# Altium footprint library Miscellaneous.PcbLib: 139 footprints (part 8 of 9)
Each footprint in its own frame and in the unit in brackets; x right, y up, seen from the top. Pads: shape width x height; smd on the part's side, far side on the other; paste and mask are expansions set on the pad; w line width, h text height; cw(c..) or ccw(c..) is an arc to the next point about the centre after c.
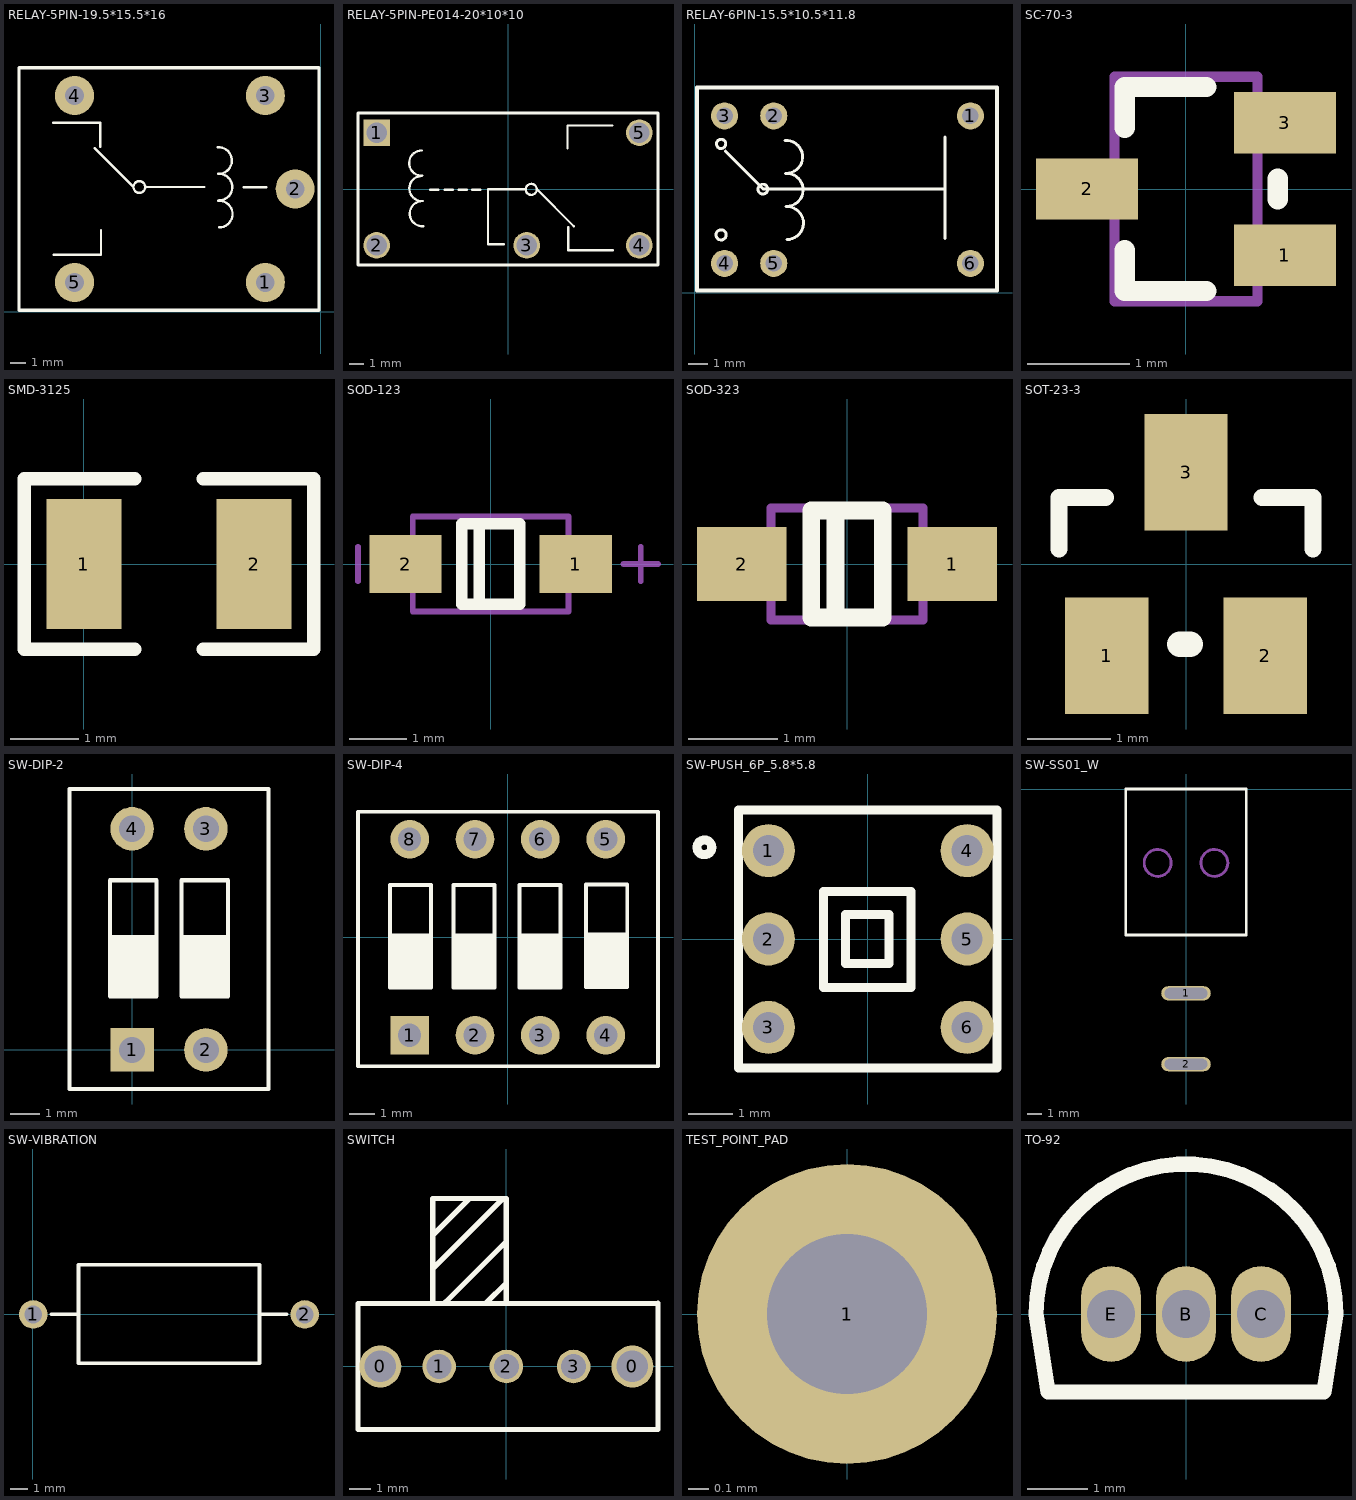
[diagram p7: the footprints below, top view; thin cyan lines are the x and y axes]

## RELAY-5PIN-19.5*15.5*16 [mm]
pads (5):
  round 2.5 hole 1.2: 1(-3.531,1.88) 2(-1.626,7.849) 3(-3.531,13.818) 4(-15.723,13.818) 5(-15.723,1.88)
Top Overlay:
  circle w0.152: c-11.582,7.976 r0.375
  lines w0.152: -17.107,12.09 -14.084,12.09 -14.084,10.541 ; -17.056,3.658 -14.034,3.658 -14.034,5.207 ; -14.453,10.465 -11.963,7.976 -11.957,7.976 ; -11.151,7.976 -7.442,7.976 ; -6.579,10.516 cw(c-6.518,9.669) -6.518,8.82 ; -6.553,8.814 cw(c-6.493,7.967) -6.493,7.118 ; -6.537,7.095 cw(c-6.477,6.248) -6.477,5.399 ; -4.902,7.95 -3.454,7.95
  lines w0.2: -19.279,1.753 -19.279,15.596 -0.102,15.596 -0.102,0.102 -19.279,0.102 -19.279,1.88
3D body "User Library-SONGLE Relay SRU-12VDC-SL-C.step": height 15.3, standoff -5, extent -19.278,0.172 -0.178,15.672

## RELAY-5PIN-PE014-20*10*10 [mm]
pads (5):
  rect 1.8x1.8 hole 1.4: 1(-8.89,3.81)
  round 1.8 hole 1.4: 2(-8.89,-3.81) 3(1.27,-3.81) 4(8.89,-3.81) 5(8.89,3.81)
Top Overlay:
  circle w0.152: c1.575,-0.025 r0.375
  lines w0.152: -5.842,2.602 ccw(c-5.842,1.753) -5.782,0.906 ; -5.826,0.883 ccw(c-5.826,0.034) -5.766,-0.813 ; -5.801,-0.819 ccw(c-5.801,-1.668) -5.74,-2.515 ; -5.258,-0.051 -4.699,-0.051 ; -4.293,-0.051 -3.734,-0.051 ; -3.353,-0.051 -2.794,-0.051 ; -2.413,-0.051 -1.854,-0.051 ; -1.346,-0.051 -1.346,-3.708 -1.346,-3.734 -0.279,-3.734 ; -1.346,-0.025 1.143,-0.025 ; 1.95,-0.025 1.956,-0.025 4.445,-2.515 ; 4.026,2.743 4.026,4.293 7.048,4.293 ; 4.077,-2.591 4.077,-4.14 7.099,-4.14
  lines w0.203: -10.15,-5.15 -10.15,5.15 10.15,5.15 10.15,-5.15 -10.15,-5.15

## RELAY-6PIN-15.5*10.5*11.8 [mm]
pads (6):
  round 1.4 hole 0.85: 1(14.249,9.144) 2(4.089,9.144) 3(1.549,9.144) 4(1.549,1.524) 5(4.089,1.524) 6(14.249,1.524)
Top Overlay:
  circle w0.152: c3.531,5.359 r0.254
  circle w0.152: c1.372,7.696 r0.241
  circle w0.152: c1.372,2.997 r0.262
  lines w0.152: 1.587,7.328 3.556,5.359 ; 3.581,5.359 12.929,5.359 ; 4.674,7.874 cw(c4.734,7.027) 4.734,6.178 ; 4.699,6.172 cw(c4.759,5.325) 4.759,4.477 ; 4.715,4.454 cw(c4.775,3.607) 4.775,2.758 ; 12.929,2.819 12.929,5.359 ; 12.929,8.052 12.929,5.359
  lines w0.2: 0.127,10.617 15.621,10.617
  lines w0.203: 0.127,10.617 0.127,0.117 5.121,0.117 9.16,0.117 15.621,0.117 15.621,6.579 15.621,10.617
3D body "User Library-HK4100F.step": height 2.24, standoff -12.32, extent 0.225,0.179 15.625,10.579

## SC-70-3 [mm]
pads (3):
  rect 1x0.6 smd: 1(0.97,-0.65) 2(-0.97,0) 3(0.97,0.65)
Top Overlay:
  lines w0.2: -0.6,-0.6 -0.6,-1 0.2,-1 ; -0.6,0.6 -0.6,1 0.2,1 ; 0.9,-0.1 0.9,0.1
Mechanical 13:
  lines w0.1: -0.7,-1.1 0.7,-1.1 0.7,1.1 -0.7,1.1 -0.7,-1.1
3D body "User Library-SOT323 (SC70-3)-1.STEP": height 1.1, standoff 0, extent -1.123,-1.1 1.122,1.1

## SMD-3125 [mm]
pads (2):
  rect 1.1x1.9 smd: 1(0,0) 2(2.5,0)
Top Overlay:
  lines w0.2: 0.75,-1.25 -0.875,-1.25 -0.875,1.25 0.75,1.25 ; 1.75,-1.25 3.375,-1.25 3.375,1.25 1.75,1.25

## SOD-123 [mm]
pads (2):
  rect 1.25x1 smd: 1(1.475,0) 2(-1.475,0)
Top Overlay:
  lines w0.2: -0.2,-0.7 -0.2,0.7 ; -0.5,-0.7 0.5,-0.7 0.5,0.7 -0.5,0.7 -0.5,-0.7
Mechanical 13:
  lines w0.1: -1.35,-0.825 -1.35,0.825 1.35,0.825 1.35,-0.825 -1.35,-0.825
Mechanical 15:
  lines w0.1: -2.3,-0.3 -2.3,0.3 ; 2.3,0 2.9,0 ; 2.6,-0.3 2.6,0.3
3D body "SOD123.STEP": height 1.35, standoff 0, extent -1.85,-0.775 1.85,0.775

## SOD-323 [mm]
pads (2):
  rect 1x0.83 smd: 1(1.18,0) 2(-1.18,0)
Top Overlay:
  lines w0.2: -0.13,-0.6 -0.13,0.6 ; -0.4,-0.6 -0.4,0.6 0.4,0.6 0.4,-0.6 -0.4,-0.6
Mechanical 13:
  lines w0.1: -0.85,-0.625 -0.85,0.625 0.85,0.625 0.85,-0.625 -0.85,-0.625
3D body "SOD323.STEP": height 1.1, standoff 0, extent -1.35,-0.625 1.35,0.625

## SOT-23-3 [mm]
pads (3):
  rect 1x1.4 smd: 1(-0.95,-1.1) 2(0.95,-1.1) 3(0,1.1)
Top Overlay:
  lines w0.203: -1.524,0.178 -1.524,0.8 -0.965,0.8 ; 0.914,0.8 1.524,0.8 1.524,0.178
  lines w0.305: -0.076,-0.965 0.051,-0.965
3D body "复件": height 1.09, standoff 0, extent -1.394,-1.224 1.4,1.202

## SW-DIP-2 [mm]
pads (4):
  rect 1.5x1.5 hole 0.9: 1(0,0)
  round 1.5 hole 0.9: 2(2.54,0) 3(2.54,7.62) 4(0,7.62)
Top Overlay:
  rectangle: 1.702,1.854 3.302,3.886
  rectangle: -0.762,1.854 0.838,3.886
  lines w0.152: -0.762,3.886 0.787,3.886 0.838,3.937 ; 1.702,3.886 3.251,3.886 3.302,3.937 ; -2.159,-1.346 4.699,-1.346 4.699,8.992 -2.159,8.992 -2.159,-1.346 ; -0.762,1.854 0.838,1.854 0.838,5.842 -0.762,5.842 -0.762,1.854 ; 1.702,1.854 1.702,5.842 3.302,5.842 3.302,1.854 1.702,1.854
3D body "User Library-DIPSWITCH.step": height 6.9, standoff -3.2, extent -2.028,-1.295 4.572,8.865

## SW-DIP-4 [mm]
pads (8):
  rect 1.5x1.5 hole 0.9: 1(-3.81,-3.81)
  round 1.5 hole 0.9: 2(-1.27,-3.81) 3(1.27,-3.81) 4(3.81,-3.81) 5(3.81,3.81) 6(1.27,3.81) 7(-1.27,3.81) 8(-3.81,3.81)
Top Overlay:
  rectangle: 3.048,-1.93 4.648,0.102
  rectangle: 0.457,-1.956 2.057,0.076
  rectangle: -2.108,-1.956 -0.508,0.076
  rectangle: -4.572,-1.956 -2.972,0.076
  lines w0.152: -4.572,0.076 -3.023,0.076 -2.972,0.127 ; -2.108,0.076 -0.559,0.076 -0.508,0.127 ; 0.457,0.076 2.007,0.076 2.057,0.127 ; 3.048,0.102 4.597,0.102 4.648,0.152 ; -5.817,-5.013 5.842,-5.013 5.842,4.877 -5.817,4.877 -5.817,-5.013 ; -4.572,-1.956 -2.972,-1.956 -2.972,2.032 -4.572,2.032 -4.572,-1.956 ; -2.108,-1.956 -2.108,2.032 -0.508,2.032 -0.508,-1.956 -2.108,-1.956 ; 0.457,-1.956 0.457,2.032 2.057,2.032 2.057,-1.956 0.457,-1.956 ; 3.048,-1.93 3.048,2.057 4.648,2.057 4.648,-1.93 3.048,-1.93
3D body "User Library-DIPSW8.step": height 7.52, standoff -2.57, extent -5.7,-4.912 5.729,4.74

## SW-PUSH_6P_5.8*5.8 [mm]
pads (6):
  round 1.2 hole 0.7: 1(-2.25,2) 2(-2.25,0) 3(-2.25,-2) 4(2.25,2) 5(2.25,0) 6(2.25,-2)
Top Overlay:
  circle w0.203: c-3.7,2.075 r0.168
  lines w0.203: -2.925,-2.925 2.925,-2.925 2.925,2.925 -2.925,2.925 -2.925,-2.925 ; -1,-1.1 0.975,-1.1 0.975,1.075 -1,1.075 -1,-1.1 ; -0.5,-0.55 0.475,-0.55 0.475,0.55 -0.5,0.55 -0.5,-0.55
3D body "User Library-PushButton KFC-5_8X5_8-02.step": height 10, standoff -3.6, extent -2.9,-2.9 2.9,2.9

## SW-SS01_W [mm]
pads (2):
  oval 3.5x1 hole 0.762 slot 3 at 0 deg: 1(0,-14.4) 2(0,-19.4)
Top Overlay:
  lines w0.203: -4.25,-10.287 4.25,-10.287 4.25,0.013 -4.25,0.013 -4.25,-10.287
Mechanical 1:
  circle w0.203: c2,-5.2 r0.95
  circle w0.203: c-2,-5.2 r0.95

## SW-VIBRATION [mm]
pads (2):
  round 1.6 hole 1: 1(0.025,0) 2(15.265,0)
Top Overlay:
  lines w0.2: 1.041,0 2.565,0 ; 2.565,-2.743 12.725,-2.743 ; 2.565,-2.718 2.565,2.794 12.7,2.794 ; 12.725,-2.718 12.725,2.782 ; 12.725,0 14.249,0

## SWITCH [mm]
pads (5):
  round 2 hole 1.5: 0(-6,0) 0(6,0)
  round 1.6 hole 1.2: 1(-3.2,0) 2(0,0) 3(3.2,0)
Top Overlay:
  lines w0.254: -7.062,2.96 -7.062,0 -7.062,-3.003 -7.059,-3 0,-3 7.218,-3 7.218,3 ; -7.062,3 0,3 ; -3.532,3 -3.5,3.032 -3.5,8 0,8 0,3 ; -3.5,4.667 -0.167,8 ; -3.5,6.258 -1.758,8 ; -2.908,3.052 0,5.96 ; -0.963,3.022 0,3.985 ; 7.218,3.006 7.212,3 0,3
3D body "User Library-SLIDE SWITCH SS12F23.STEP": height 5.25, standoff -3.85, extent -6.486,-0.634 6.514,12.266

## TEST_POINT_PAD [mm]
pads (1):
  round 1.5 hole 0.8: 1(0,0)

## TO-92 [mm]
pads (3):
  oval 1x1.6 hole 0.8: B(0,0) C(1.25,0) E(-1.25,0)
Top Overlay:
  lines w0.254: -2.5,0 cw(c0,0) 2.5,0 2.3,-1.3 -2.3,-1.3 -2.5,0
3D body "TO-92.STEP": height 4, standoff -3, extent -2.3,-1.2 2.28,2.34